# Altium integrated library Stabilizators.IntLib: 148 symbols
Pins are listed as number, name and electrical type; pins without a type are passive.

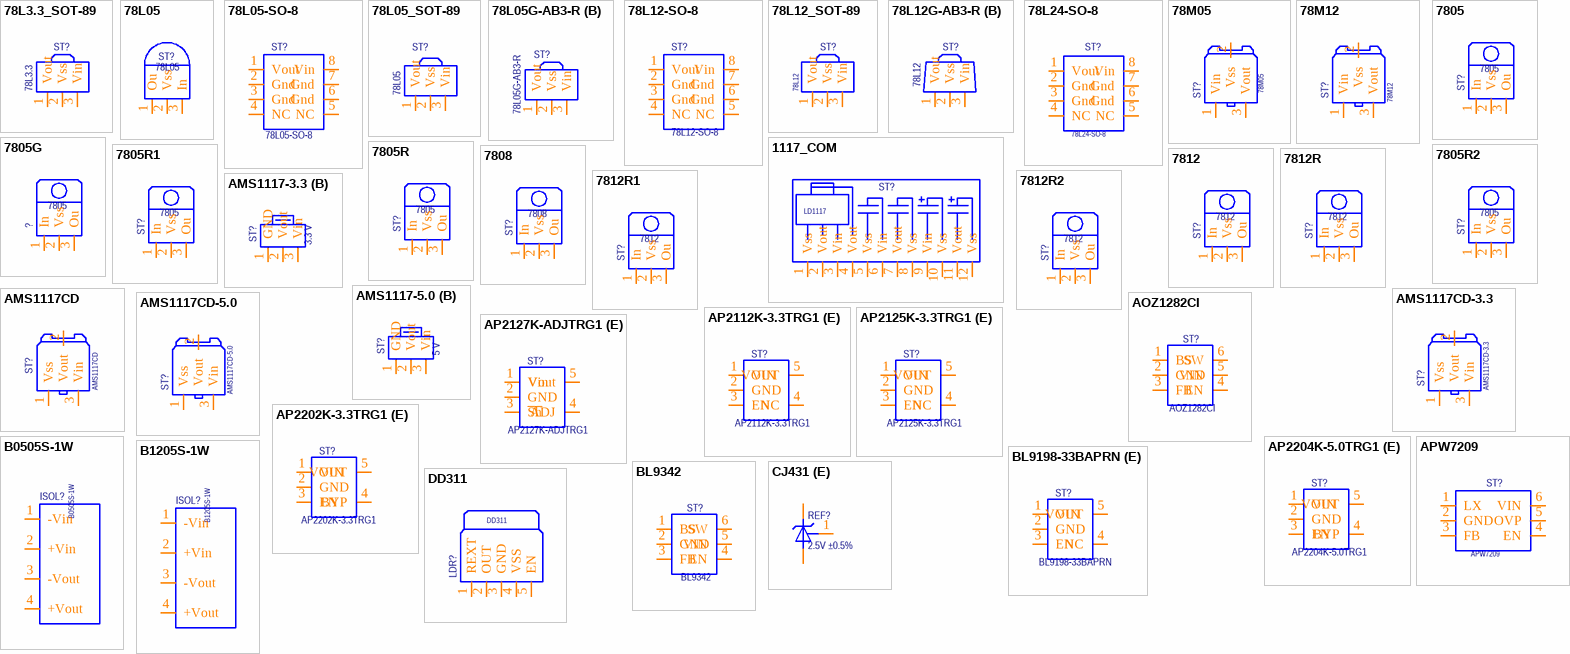
[diagram p0: symbols 78L3.3_SOT-89 to DD311]

## 78L3.3_SOT-89
designator ST?  (value not drawn)
Value: *; Publisher: Catcatcat Electronics; Operating Temperature: -40C to +85C; Website developer: http://catcatcat.d-lan.dp.ua/; Assembly type: Basic Extended Part
footprint SOT-89
footprint SOT-89 ST
pins: 1 Vout, 2 Vss, 3 Vin
text: 78L3.3

## 78L05
designator ST?  value 78L05  (hidden comment: *)
Publisher: Catcatcat Electronics; Operating Temperature: -40C to +85C; Website developer: http://catcatcat.d-lan.dp.ua/; Assembly type: Basic Extended Part
footprint TO-92
footprint SO8
footprint SOT-89
pins: 1 Ou, 2 Vss, 3 In

## 78L05-SO-8
designator ST?  (value not drawn)
Value: {Value}; Publisher: Catcatcat Electronics; Operating Temperature: -40C to +85C; Website developer: http://catcatcat.d-lan.dp.ua/; Assembly type: Basic Extended Part
footprint SO8
pins: 1 Vout, 2 Gnd, 3 Gnd, 4 NC, 5 NC, 6 Gnd, 7 Gnd, 8 Vin

## 78L05_SOT-89
designator ST?  (value not drawn)
Value: {Value}; Publisher: Catcatcat Electronics; Operating Temperature: -40C to +85C; Website developer: http://catcatcat.d-lan.dp.ua/; Assembly type: Basic Extended Part
footprint SOT-89
pins: 1 Vout, 2 Vss (power), 3 Vin
text: 78L05

## 78L05G-AB3-R (B)
designator ST?, comment 78L05G-AB3-R
LINEAR VOLTAGE REGULATORS SOT-89(SOT-89-3) ROHS; Manufacturer: Unisonic Tech; Package / Case: SOT-89-3; PartNumber LCSC: C71136; Publisher: Catcatcat Electronics; Operating Temperature: -40C to +85C; HelpURL: https://datasheet.lcsc.com/szlcsc/Advanced-Monolithic-Systems-AMS-AMS1117-5-0_C6187.pdf; Manufacturer PartNumber: 78L05G-AB3-R; Website developer: http://catcatcat.d-lan.dp.ua/; Detailed Description: LINEAR VOLTAGE REGULATORS SOT-89(SOT-89-3) ROHS; Pricing LCSC: 0.0557; Assembly type: Basic Part; Value: 78L05G-AB3-R
footprint SOT-89-3
pins: 1 Vout, 2 Vss (power), 3 Vin

## 78L12-SO-8
designator ST?  (value not drawn)
Value: {Value}; Publisher: Catcatcat Electronics; Operating Temperature: -40C to +85C; Website developer: http://catcatcat.d-lan.dp.ua/; Assembly type: Basic Extended Part
footprint SO8
pins: 1 Vout, 2 Gnd, 3 Gnd, 4 NC, 5 NC, 6 Gnd, 7 Gnd, 8 Vin

## 78L12_SOT-89
designator ST?  (value not drawn)
Value: {Value}; Publisher: Catcatcat Electronics; Operating Temperature: -40C to +85C; Website developer: http://catcatcat.d-lan.dp.ua/; Assembly type: Basic Extended Part
footprint SOT-89
pins: 1 Vout, 2 Vss, 3 Vin
text: 78L12

## 78L12G-AB3-R (B)
designator ST?, comment value 78L12  (hidden comment: 78L12G-AB3-R)
12 V out LINEAR VOLTAGE REGULATORS SOT-89(SOT-89-3) ROHS; Manufacturer: Unisonic Tech; Package / Case: SOT-89-3; PartNumber LCSC: C75501; Publisher: Catcatcat Electronics; Note: LINEAR VOLTAGE REGULATORS; Operating Temperature: -40C to +85C; HelpURL: https://datasheet.lcsc.com/szlcsc/Unisonic-Tech-78L12G-AB3-R_C75501.pdf; Manufacturer PartNumber: 78L12G-AB3-R; Website developer: http://catcatcat.d-lan.dp.ua/; Detailed Description: LINEAR VOLTAGE REGULATORS SOT-89(SOT-89-3) ROHS; Pricing LCSC: 0.0826; Assembly type: Basic Part
footprint SOT-89
footprint SOT-89 ST
pins: 1 Vout, 2 Vss, 3 Vin

## 78L24-SO-8
designator ST?  (value not drawn)
Value: {Value}; Publisher: Catcatcat Electronics; Operating Temperature: -40C to +85C; Website developer: http://catcatcat.d-lan.dp.ua/; Assembly type: Basic Extended Part
footprint SO8
pins: 1 Vout, 2 Gnd, 3 Gnd, 4 NC, 5 NC, 6 Gnd, 7 Gnd, 8 Vin

## 78M05
designator ST?  (value not drawn)
Value: {Value}; Publisher: Catcatcat Electronics; Operating Temperature: -40C to +85C; Website developer: http://catcatcat.d-lan.dp.ua/; Assembly type: Basic Extended Part
footprint DPAK
footprint 223-DPAC
pins: 1 Vin, 2 Vss, 3 Vout

## 78M12
designator ST?  (value not drawn)
Value: {Value}; Publisher: Catcatcat Electronics; Operating Temperature: -40C to +85C; Website developer: http://catcatcat.d-lan.dp.ua/; Assembly type: Basic Extended Part
footprint DPAK
footprint 223-DPAC
pins: 1 Vin, 2 Vss, 3 Vout

## 1117_COM
designator ST?  (value not drawn)
Value: {Value}; Publisher: Catcatcat Electronics; Operating Temperature: -40C to +85C; Website developer: http://catcatcat.d-lan.dp.ua/; Assembly type: Basic Extended Part
footprint 1117_COM
pins: 1 Vss, 2 Vout, 3 Vin, 4 Vout, 5 Vss, 6 Vin, 7 Vout, 8 Vss, 9 Vin, 10 Vss, 11 Vout, 12 Vss
text: LD1117

## 7805
designator ST?  value 7805  (hidden comment: *)
Publisher: Catcatcat Electronics; Operating Temperature: -40C to +85C; Website developer: http://catcatcat.d-lan.dp.ua/; Assembly type: Basic Extended Part
footprint TO-220A
pins: 1 In, 2 Vss, 3 Ou

## 7805G
designator ?  value 7805  (hidden comment: *)
Publisher: Catcatcat Electronics; Operating Temperature: -40C to +85C; Website developer: http://catcatcat.d-lan.dp.ua/; Assembly type: Basic Extended Part
footprint TO-220G
pins: 1 In, 2 Vss, 3 Ou

## 7805R
designator ST?  value 7805  (hidden comment: *)
Publisher: Catcatcat Electronics; Operating Temperature: -40C to +85C; Website developer: http://catcatcat.d-lan.dp.ua/; Assembly type: Basic Extended Part
footprint TO-220R
pins: 1 In, 2 Vss, 3 Ou

## 7805R1
designator ST?  value 7805  (hidden comment: *)
Publisher: Catcatcat Electronics; Operating Temperature: -40C to +85C; Website developer: http://catcatcat.d-lan.dp.ua/; Assembly type: Basic Extended Part
footprint TO-220-R1
pins: 1 In, 2 Vss, 3 Ou

## 7805R2
designator ST?  value 7805  (hidden comment: *)
Publisher: Catcatcat Electronics; Operating Temperature: -40C to +85C; Website developer: http://catcatcat.d-lan.dp.ua/; Assembly type: Basic Extended Part
footprint TO-220-R2
pins: 1 In, 2 Vss, 3 Ou

## 7808
designator ST?  value 7808  (hidden comment: *)
Publisher: Catcatcat Electronics; Operating Temperature: -40C to +85C; Website developer: http://catcatcat.d-lan.dp.ua/; Assembly type: Basic Extended Part
footprint TO220
pins: 1 In, 2 Vss, 3 Ou

## 7812
designator ST?  value 7812  (hidden comment: *)
Publisher: Catcatcat Electronics; Operating Temperature: -40C to +85C; Website developer: http://catcatcat.d-lan.dp.ua/; Assembly type: Basic Extended Part
footprint TO-220A
pins: 1 In, 2 Vss, 3 Ou

## 7812R
designator ST?  value 7812  (hidden comment: *)
Publisher: Catcatcat Electronics; Operating Temperature: -40C to +85C; Website developer: http://catcatcat.d-lan.dp.ua/; Assembly type: Basic Extended Part
footprint TO-220R
pins: 1 In, 2 Vss, 3 Ou

## 7812R1
designator ST?  value 7812  (hidden comment: *)
Publisher: Catcatcat Electronics; Operating Temperature: -40C to +85C; Website developer: http://catcatcat.d-lan.dp.ua/; Assembly type: Basic Extended Part
footprint TO-220-R1
pins: 1 In, 2 Vss, 3 Ou

## 7812R2
designator ST?  value 7812  (hidden comment: *)
Publisher: Catcatcat Electronics; Operating Temperature: -40C to +85C; Website developer: http://catcatcat.d-lan.dp.ua/; Assembly type: Basic Extended Part
footprint TO-220-R2
pins: 1 In, 2 Vss, 3 Ou

## AMS1117-3.3 (B)
designator ST?, comment value 3.3 V  (hidden comment: AMS1117-3.3)
LOW DROPOUT REGULATORS(LDO) POSITIVE FIXED 1.3V @ 800MA 15V 3.3V 1A SOT-223 ROHS; Manufacturer: Advanced Monolithic Systems; Dealer Аlternative: https://detail.1688.com/offer/520494292842.html; Package / Case: SOT-223; PartNumber LCSC: C6186; Publisher: Catcatcat Electronics; Note: LDO; Operating Temperature: -40 to 125° C; HelpURL: https://datasheet.lcsc.com/szlcsc/1811201117_Advanced-Monolithic-Systems-AMS-AMS1117-3-3_C6186.pdf; Website developer: http://catcatcat.d-lan.dp.ua/; Detailed Description: LOW DROPOUT REGULATORS(LDO) POSITIVE FIXED 1.3V @ 800MA 15V 3.3V 1A SOT-223 ROHS; Pricing LCSC: 0.1193; Assembly type: Basic Part; Supply Input Voltage: 15 V; Voltage: 3.3 V
footprint SOT-223
pins: 1 GND, 2 Vout, 3 Vin

## AMS1117-5.0 (B)
designator ST?, comment value 5 V  (hidden comment: AMS1117-5.0)
LOW DROPOUT REGULATORS(LDO) POSITIVE FIXED 1.3V @ 1A 15V 5V 1A SOT-223 ROHS; Manufacturer: Advanced Monolithic Systems; Dealer Аlternative: https://detail.1688.com/offer/538628349035.html; Package / Case: SOT-223; PartNumber LCSC: C6187; Publisher: Catcatcat Electronics; Note: LDO; Operating Temperature: -40 to 125° C; HelpURL: https://datasheet.lcsc.com/szlcsc/Advanced-Monolithic-Systems-AMS-AMS1117-5-0_C6187.pdf; Manufacturer PartNumber: AMS1117-5.0; Website developer: http://catcatcat.d-lan.dp.ua/; Detailed Description: LOW DROPOUT REGULATORS(LDO) POSITIVE FIXED 1.3V @ 1A 15V 5V 1A SOT-223 ROHS; Pricing LCSC: 0.1283; Assembly type: Basic Extended Part
footprint SOT-223
pins: 1 GND, 2 Vout, 3 Vin

## AMS1117CD
designator ST?  (value not drawn)
Value: 3.3 V; Note: AMS1117; Dealer Аlternative: https://detail.1688.com/offer/534895728311.html; Package / Case: DPAK; PartNumber Digi-Key: 0.2; PartNumber LCSC: 0.032; Publisher: Catcatcat Electronics; Operating Temperature: -40 to 125° C; Website developer: http://catcatcat.d-lan.dp.ua/; Assembly type: Basic Extended Part
footprint DPAK_SOT223
pins: 1 Vss, 2 Vout, 3 Vin

## AMS1117CD-3.3
designator ST?  (value not drawn)
DPAK 3.3V; Note: AMS1117; Value: 3.3 V; Dealer Аlternative: https://detail.1688.com/offer/534895728311.html; Package / Case: DPAK (TO-252); PartNumber Digi-Key: 0.2; PartNumber LCSC: 0.032; Publisher: Catcatcat Electronics; Operating Temperature: -40 to 125° C; Website developer: http://catcatcat.d-lan.dp.ua/; Assembly type: Basic Extended Part
footprint DPAK_SOT223
pins: 1 Vss, 2 Vout, 3 Vin

## AMS1117CD-5.0
designator ST?  (value not drawn)
DPAK 5.0V; Note: AMS1117; Value: 5.0 V; Dealer Аlternative: https://detail.1688.com/offer/534895728311.html; Package / Case: DPAK (TO-252); PartNumber Digi-Key: 0.2; PartNumber LCSC: 0.032; Publisher: Catcatcat Electronics; Operating Temperature: -40 to 125° C; Website developer: http://catcatcat.d-lan.dp.ua/; Assembly type: Basic Extended Part
footprint DPAK_SOT223
pins: 1 Vss, 2 Vout, 3 Vin

## AOZ1282CI
designator ST?  value AOZ1282CI  (hidden comment: *)
SOT-23-6, IN 4.5V 36V, OU 0.8V 36V 1.2A DC-DC Converters Step-Down Adjustable 1; Manufacturer: Alpha & Omega Semicon/AOS; Voltage: 4.5V 30V 0.8V 15V 1.2A; Marking: 702K3 AZ00; Detailed Description: DC-DC Converters Step-Down Adjustable 1 4.5V 36V 0.8V 36V 1.2A SOT-23-6 RoHS; Pricing Аlternative: 0.2591; ComponentLink1URL: http://www.microchip.com/wwwproducts/en/en554058; ComponentLink2URL: http://ww1.microchip.com/downloads/en/DeviceDoc/20005004D.pdf; Dealer LCSC: https://lcsc.com/product-detail/DC-DC-Converters_Alpha-Omega-Semicon_AOZ1282CI_Alpha-Omega-Semicon-AOS-AOZ1282CI_C111916.html; Package / Case: SOT-23-6; PartNumber LCSC: C111916; Operating Temperature: -40C to +85C; HelpURL: https://datasheet.lcsc.com/szlcsc/Alpha-Omega-Semicon-AOS-AOZ1282CI_C111916.pdf; Manufacturer PartNumber: AOZ1282CI; Publisher: Catcatcat Electronics; Website developer: http://catcatcat.d-lan.dp.ua/; Assembly type: Basic Extended Part
footprint SOT457 (SC-74; TSOP6)
pins: 1 BS, 2 GND, 3 FB, 4 EN, 5 VIN, 6 SW

## AP2112K-3.3TRG1 (E)
designator ST?, comment AP2112K-3.3TRG1
SOT-25 Vin 6.5V  Vout 3.3V 600mA; Manufacturer: Diodes Incorporated; Marking: G3P; Detailed Description: LOW DROPOUT REGULATORS(LDO) SOT-25 ROHS; ComponentLink1URL: http://www.microchip.com/wwwproducts/en/en554058; ComponentLink2URL: http://ww1.microchip.com/downloads/en/DeviceDoc/20005004D.pdf; Package / Case: SOT-25; PartNumber LCSC: C51118; Operating Temperature: -40C to +85C; Voltage: Vin 6.5V  Vout 3.3V 600mA; HelpURL: https://datasheet.lcsc.com/szlcsc/Diodes-Incorporated-AP2112K-3-3TRG1_C51118.pdf; Manufacturer PartNumber: AP2112K-3.3TRG1; Pricing LCSC: 0.1350; Publisher: Catcatcat Electronics; Website developer: http://catcatcat.d-lan.dp.ua/; Assembly type: Extended Part; Value: AP2112K-3.3TRG1
footprint SOT753 (SOT25, TSOP5)
pins: 1 VIN, 2 GND, 3 EN, 4 NC, 5 VOUT

## AP2125K-3.3TRG1 (E)
designator ST?, comment AP2125K-3.3TRG1
SOT-25 Vin 6.5V  Vout 3.3V 300mA; Manufacturer: Diodes Incorporated; Voltage: Vin 6.5V  Vout 3.3V 600mA; Marking: GCG; Detailed Description: LOW DROPOUT REGULATORS(LDO) POSITIVE FIXED 300MV @ 300MA 6V 3.3V 360MA SOT-23-5 ROHS; ComponentLink1URL: http://www.microchip.com/wwwproducts/en/en554058; ComponentLink2URL: http://ww1.microchip.com/downloads/en/DeviceDoc/20005004D.pdf; Package / Case: SOT-23-5; PartNumber LCSC: C110463; Operating Temperature: -40C to +85C; HelpURL: https://datasheet.lcsc.com/szlcsc/Diodes-Incorporated-AP2125K-3-3TRG1_C110463.pdf; Manufacturer PartNumber: AP2125K-3.3TRG1; Pricing LCSC: 0.1040; Publisher: Catcatcat Electronics; Website developer: http://catcatcat.d-lan.dp.ua/; Assembly type: Extended Part; Value: AP2125K-3.3TRG1
footprint SOT753 (SOT25, TSOP5)
pins: 1 VIN, 2 GND, 3 EN, 4 NC, 5 VOUT

## AP2127K-ADJTRG1 (E)
designator ST?, comment AP2127K-ADJTRG1
SOT-25 Vin 6V  ADJ 300mA; Manufacturer: Diodes Incorporated; Marking: S2RC; Detailed Description: LOW DROPOUT REGULATORS(LDO) POSITIVE ADJUSTABLE 300MV @ 300MA 6V 0.8V 5.5V 400MA SOT-23-5 ROHS; ComponentLink1URL: http://www.microchip.com/wwwproducts/en/en554058; ComponentLink2URL: http://ww1.microchip.com/downloads/en/DeviceDoc/20005004D.pdf; Package / Case: SOT-23-5; PartNumber LCSC: C96343; Operating Temperature: -40C to +85C; Voltage: Vin 6V  ADJ 300mA; HelpURL: https://datasheet.lcsc.com/szlcsc/Diodes-Incorporated-AP2127K-ADJTRG1_C96343.pdf; Manufacturer PartNumber: AP2127K-ADJTRG1; Pricing LCSC: 0.0606; Publisher: Catcatcat Electronics; Website developer: http://catcatcat.d-lan.dp.ua/; Assembly type: Extended Part; Value: AP2127K-ADJTRG1
footprint SOT753 (SOT25, TSOP5)
pins: 1 Vin, 2 GND, 3 ~{Sh}, 4 ADJ, 5 Vout

## AP2202K-3.3TRG1 (E)
designator ST?, comment AP2202K-3.3TRG1
SOT-25 Vin 6.5V  Vout 3.3V 150mA; Manufacturer: Diodes Incorporated; Marking: G2L; Detailed Description: LOW DROPOUT REGULATORS(LDO) SOT-23-5 ROHS; ComponentLink1URL: http://www.microchip.com/wwwproducts/en/en554058; ComponentLink2URL: http://ww1.microchip.com/downloads/en/DeviceDoc/20005004D.pdf; Package / Case: SOT-23-5; PartNumber LCSC: C150442; Operating Temperature: -40C to +85C; Voltage: Vin 6.5V  Vout 3.3V 150mA; HelpURL: https://datasheet.lcsc.com/szlcsc/Diodes-Incorporated-AP2202K-3-3TRG1_C150442.pdf; Manufacturer PartNumber: AP2202K-3.3TRG1; Pricing LCSC: 0.0959; Publisher: Catcatcat Electronics; Website developer: http://catcatcat.d-lan.dp.ua/; Assembly type: Extended Part; Value: AP2202K-3.3TRG1
footprint SOT753 (SOT25, TSOP5)
pins: 1 VIN, 2 GND, 3 EN, 4 BYP, 5 VOUT

## AP2204K-5.0TRG1 (E)
designator ST?, comment AP2204K-5.0TRG1
SOT-25 Vin 6.5V  Vout 5V 150mA; Manufacturer: Diodes Incorporated; Marking: GAI; Detailed Description: LOW DROPOUT REGULATORS(LDO) POSITIVE FIXED 500MV @ 150MA 24V 5V 200MA SOT-23-5 ROHS; ComponentLink1URL: http://www.microchip.com/wwwproducts/en/en554058; ComponentLink2URL: http://ww1.microchip.com/downloads/en/DeviceDoc/20005004D.pdf; Package / Case: SOT-23-5; PartNumber LCSC: C112031; Operating Temperature: -40C to +85C; Voltage: Vin 6.5V  Vout 5V 150mA; HelpURL: https://datasheet.lcsc.com/szlcsc/Diodes-Incorporated-AP2204K-5-0TRG1_C112031.pdf; Manufacturer PartNumber: AP2204K-5.0TRG1; Pricing LCSC: 0.1558; Publisher: Catcatcat Electronics; Website developer: http://catcatcat.d-lan.dp.ua/; Assembly type: Extended Part; Value: AP2204K-5.0TRG1
footprint SOT753 (SOT25, TSOP5)
pins: 1 VIN, 2 GND, 3 EN, 4 BYP, 5 VOUT

## APW7209
designator ST?  (value not drawn)
Value: {Value}; Publisher: Catcatcat Electronics; Operating Temperature: -40C to +85C; Website developer: http://catcatcat.d-lan.dp.ua/; Assembly type: Basic Extended Part
footprint SOT-23-6N
pins: 1 LX, 2 GND, 3 FB, 4 EN, 5 OVP, 6 VIN

## B0505S-1W
designator ISOL?  (value not drawn)
Value: {Value}; Publisher: Catcatcat Electronics; Operating Temperature: -40C to +85C; Website developer: http://catcatcat.d-lan.dp.ua/; Assembly type: Basic Extended Part
footprint 4PINSIP
pins: 1 -Vin, 2 +Vin, 3 -Vout, 4 +Vout

## B1205S-1W
designator ISOL?  (value not drawn)
Value: {Value}; Publisher: Catcatcat Electronics; Operating Temperature: -40C to +85C; Website developer: http://catcatcat.d-lan.dp.ua/; Assembly type: Basic Extended Part
footprint 4PINSIP
pins: 1 -Vin, 2 +Vin, 3 -Vout, 4 +Vout

## BL9198-33BAPRN (E)
designator ST?, comment BL9198-33BAPRN
SOT-25 Vin 6.5V  Vout 3.3V 300mA; Manufacturer: Diodes Incorporated; Note: LOW DROPOUT REGULATORS(LDO); Marking: DK__; Detailed Description: LOW DROPOUT REGULATORS(LDO) POSITIVE FIXED 300MV @ 300MA 6V 3.3V 300MA SOT-23-5 ROHS; ComponentLink1URL: http://www.microchip.com/wwwproducts/en/en554058; ComponentLink2URL: http://ww1.microchip.com/downloads/en/DeviceDoc/20005004D.pdf; Package / Case: SOT-23-5; PartNumber LCSC: C51282; Operating Temperature: -40C to +85C; Voltage: Vin 6.5V  Vout 3.3V 300mA; HelpURL: https://datasheet.lcsc.com/szlcsc/Shanghai-Belling-BL9198-33BAPRN_C51282.pdf; Manufacturer PartNumber: BL9198-33BAPRN; Pricing LCSC: 0.0590; Publisher: Catcatcat Electronics; Website developer: http://catcatcat.d-lan.dp.ua/; Assembly type: Extended Part; Value: BL9198-33BAPRN
footprint SOT753 (SOT25, TSOP5)
pins: 1 VIN, 2 GND, 3 EN, 4 NC, 5 VOUT

## BL9342
designator ST?  value BL9342  (hidden comment: *)
SOT-23-6, IN 4.2V 40V, OU 0.8V 40V 1.2A DC-DC Converters Step-Down Adjustable 1; Manufacturer: Shanghai Belling; Voltage: 1 4.2V 40V 40V 600mA; Marking: 8NJN; Detailed Description: DC-DC Converters Step-Down Adjustable 1 4.2V 40V 40V 600mA SOT-23-6 RoHS; ComponentLink1URL: http://www.microchip.com/wwwproducts/en/en554058; ComponentLink2URL: http://ww1.microchip.com/downloads/en/DeviceDoc/20005004D.pdf; Dealer LCSC: https://lcsc.com/product-detail/DC-DC-Converters_BL9342_C93176.html; Package / Case: SOT-23-6; PartNumber LCSC: C93176; Operating Temperature: -40C to +85C; HelpURL: https://datasheet.lcsc.com/szlcsc/Shanghai-Belling-BL9342_C93176.pdf; Manufacturer PartNumber: BL9342; Pricing LCSC: 0.1818; Publisher: Catcatcat Electronics; Website developer: http://catcatcat.d-lan.dp.ua/; Assembly type: Basic Extended Part
footprint SOT457 (SC-74; TSOP6)
pins: 1 BS, 2 GND, 3 FB, 4 EN, 5 VIN, 6 SW

## CJ431 (E)
designator REF?, comment value 2.5V ±0.5%  (hidden comment: CJ431)
VOLTAGE REFERENCES 2.5V 36V ±0.5% 50PPM/°C SOT-23(SOT-23-3) ROHS; Manufacturer: Changjiang Electronics Tech (CJ); Marking: 431; Package / Case: SOT-23; PartNumber LCSC: C3113; Publisher: Catcatcat Electronics; Note: VOLTAGE REFERENCES 2.5V; Operating Temperature: -40C to +85C; Tolerance: ±0.5%; Voltage: 2.5V ±0.5%; HelpURL: https://datasheet.lcsc.com/szlcsc/Changjiang-Electronics-Tech-CJ-CJ431_C3113.pdf; Manufacturer PartNumber: CJ431; Website developer: http://catcatcat.d-lan.dp.ua/; Detailed Description: VOLTAGE REFERENCES 2.5V 36V ±0.5% 50PPM/°C SOT-23(SOT-23-3) ROHS; Pricing LCSC: 0.0441; Assembly type: Extended Part
footprint SOT-23-3M
pins: 1 REF, 2 CATHODE, 3 ANODE

## DD311
designator LDR?  (value not drawn)
Value: {Value}; Publisher: Catcatcat Electronics; Operating Temperature: -40C to +85C; Website developer: http://catcatcat.d-lan.dp.ua/; Assembly type: Basic Extended Part
footprint DD311
pins: 1 REXT, 2 OUT, 3 GND, 4 VSS, 5 EN

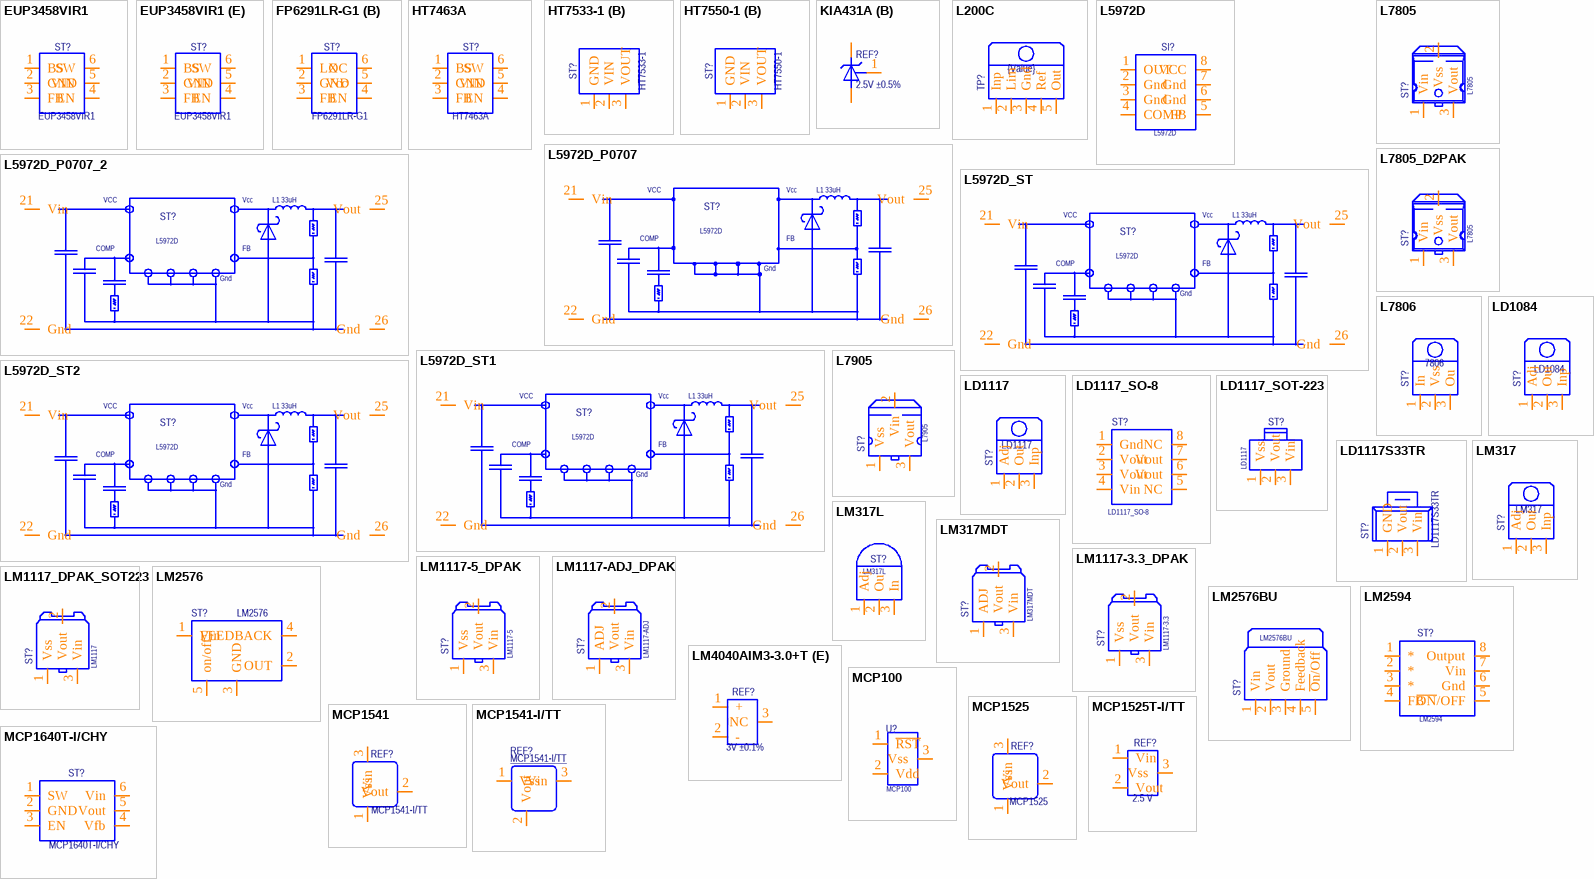
[diagram p1: symbols EUP3458VIR1 to MCP1640T-I/CHY]

## EUP3458VIR1
designator ST?  value EUP3458VIR1  (hidden comment: *)
SOT-23-6, IN 4.5V-30V, OU 0.8V-15V 1.2A DC-DC Converters Step-Down Adjustable 1; Manufacturer: Eutech Microelectronics; Voltage: 4.5V 30V 0.8V 15V 1.2A; Marking: 702K3 AZ00; Detailed Description: DC-DC Converters Step-Down Adjustable 1 4.5V 30V 0.8V 15V 1.2A SOT-23-6 RoHS; ComponentLink1URL: http://www.microchip.com/wwwproducts/en/en554058; ComponentLink2URL: http://ww1.microchip.com/downloads/en/DeviceDoc/20005004D.pdf; Dealer LCSC: https://lcsc.com/product-detail/DC-DC-Converters_EUP3458VIR1_C89300.html; Package / Case: SOT-23-6; PartNumber LCSC: C89300; Operating Temperature: -40C to +85C; HelpURL: https://datasheet.lcsc.com/szlcsc/Eutech-Microelectronics-EUP3458VIR1_C89300.pdf; Manufacturer PartNumber: EUP3458VIR1; Pricing LCSC: 0.1606; Publisher: Catcatcat Electronics; Website developer: http://catcatcat.d-lan.dp.ua/; Assembly type: Basic Extended Part
footprint SOT457 (SC-74; TSOP6)
pins: 1 BS, 2 GND, 3 FB, 4 EN, 5 VIN, 6 SW

## EUP3458VIR1 (E)
designator ST?, comment EUP3458VIR1
SOT-23-6, IN 4.5V-30V, OU 0.8V-15V 1.2A DC-DC Converters Step-Down Adjustable 1; Manufacturer: Eutech Microelectronics; Voltage: 4.5V 30V 0.8V 15V 1.2A; Marking: 702K3 AZ00; Detailed Description: DC-DC Converters Step-Down Adjustable 1 4.5V 30V 0.8V 15V 1.2A SOT-23-6 RoHS; ComponentLink1URL: http://www.microchip.com/wwwproducts/en/en554058; ComponentLink2URL: http://ww1.microchip.com/downloads/en/DeviceDoc/20005004D.pdf; Package / Case: SOT-23-6; PartNumber LCSC: C89300; Note: DC-DC CONVERTERS STEP-DOWN ADJ; Operating Temperature: -40C to +85C; HelpURL: https://datasheet.lcsc.com/szlcsc/Eutech-Microelectronics-EUP3458VIR1_C89300.pdf; Manufacturer PartNumber: EUP3458VIR1; Pricing LCSC: 0.1292; Publisher: Catcatcat Electronics; Website developer: http://catcatcat.d-lan.dp.ua/; Assembly type: Extended Part; Value: EUP3458VIR1
footprint SOT457 (SC-74; TSOP6)
pins: 1 BS, 2 GND, 3 FB, 4 EN, 5 VIN, 6 SW

## FP6291LR-G1 (B)
designator ST?, comment FP6291LR-G1
DC-DC CONVERTERS STEP-UP ADJUSTABLE 1 2.6V 5.5V 12V 2A SOT-23-6 ROHS; Manufacturer: Feeling Tech; Marking: AL968; ComponentLink1URL: http://www.microchip.com/wwwproducts/en/en554058; ComponentLink2URL: http://ww1.microchip.com/downloads/en/DeviceDoc/20005004D.pdf; Package / Case: SOT-23-6; PartNumber LCSC: C18701; Publisher: Catcatcat Electronics; Note: DC-DC CONVERTERS STEP-UP; Operating Temperature: -40°C ~ 125°C (TJ); Voltage: 1 2.6V 5.5V 12V 2A; HelpURL: https://datasheet.lcsc.com/szlcsc/1812101116_Feeling-Tech-FP6291LR-G1_C18701.pdf; Manufacturer PartNumber: FP6291LR-G1; Website developer: http://catcatcat.d-lan.dp.ua/; Detailed Description: DC-DC CONVERTERS STEP-UP ADJUSTABLE 1 2.6V 5.5V 12V 2A SOT-23-6 ROHS; Pricing LCSC: 0.1278; Assembly type: Basic Part; Supply Input Voltage: 2.6V 5.5V; Value: FP6291LR-G1
footprint SOT-23-6L
pins: 1 LX, 2 GND, 3 FB, 4 EN, 5 Vcc, 6 OC

## HT7463A
designator ST?  value HT7463A  (hidden comment: *)
SOT-23-6, IN 5V 50V, OU 0.6V 50V 0.8A DC-DC Converters Step-Down Adjustable 1; Manufacturer: Holtek Semicon; Voltage: 4.5V 52V 1V 600mA; Marking: 463A; Detailed Description: DC-DC Converters Step-Down Adjustable 1 4.5V 52V 1V 600mA SOT-23-6 RoHS; ComponentLink1URL: http://www.microchip.com/wwwproducts/en/en554058; ComponentLink2URL: http://ww1.microchip.com/downloads/en/DeviceDoc/20005004D.pdf; Dealer LCSC: https://lcsc.com/product-detail/DC-DC-Converters_HT7463A_C111872.html; Package / Case: SOT-23-6; PartNumber LCSC: C111872; Operating Temperature: -40C to +85C; HelpURL: https://datasheet.lcsc.com/szlcsc/Holtek-Semicon-HT7463A_C111872.pdf; Manufacturer PartNumber: HT7463A; Pricing LCSC: 0.1379; Publisher: Catcatcat Electronics; Website developer: http://catcatcat.d-lan.dp.ua/; Assembly type: Basic Extended Part
footprint SOT457 (SC-74; TSOP6)
pins: 1 BS, 2 GND, 3 FB, 4 EN, 5 VIN, 6 SW

## HT7533-1 (B)
designator ST?, comment HT7533-1
LOW DROPOUT REGULATORS(LDO) POSITIVE FIXED 55MV @ 1MA 30V 3.3V 100MA SOT-89(SOT-89-3) ROHS; Manufacturer: Holtek Semicon; Voltage: Vin 30.0 Vout 3.3V; Marking: 7533-1; ComponentLink1URL: http://www.microchip.com/wwwproducts/en/en554058; ComponentLink2URL: http://ww1.microchip.com/downloads/en/DeviceDoc/20005004D.pdf; Package / Case: SOT-89-3; PartNumber LCSC: C14289; Note: LDO; Operating Temperature: -40C to +85C; HelpURL: https://datasheet.lcsc.com/szlcsc/1812071811_Holtek-Semicon-HT7533-1_C14289.pdf; Manufacturer PartNumber: HT7533-1; Detailed Description: LOW DROPOUT REGULATORS(LDO) POSITIVE FIXED 55MV @ 1MA 30V 3.3V 100MA SOT-89(SOT-89-3) ROHS; Pricing LCSC: 0.1189; Publisher: Catcatcat Electronics; Website developer: http://catcatcat.d-lan.dp.ua/; Assembly type: Basic Part; Value: HT7533-1
footprint SOT-89
footprint SOT-89 NPX
pins: 1 GND, 2 VIN, 3 VOUT

## HT7550-1 (B)
designator ST?, comment HT7550-1
LOW DROPOUT REGULATORS(LDO) POSITIVE FIXED 55MV @ 1MA 30V 5V 150MA SOT-89(SOT-89-3) ROHS; Manufacturer: Holtek Semicon; Voltage: Vin 30.0 Vout 3.3V; Marking: 7533-1; ComponentLink1URL: http://www.microchip.com/wwwproducts/en/en554058; ComponentLink2URL: http://ww1.microchip.com/downloads/en/DeviceDoc/20005004D.pdf; Package / Case: SOT-89-3; PartNumber LCSC: C16106; Note: LDO; Operating Temperature: -40C to +85C; HelpURL: https://datasheet.lcsc.com/szlcsc/1812071811_Holtek-Semicon-HT7550-1_C16106.pdf; Manufacturer PartNumber: HT7550-1; Detailed Description: LOW DROPOUT REGULATORS(LDO) POSITIVE FIXED 55MV @ 1MA 30V 5V 150MA SOT-89(SOT-89-3) ROHS; Pricing LCSC: 0.1189; Publisher: Catcatcat Electronics; Website developer: http://catcatcat.d-lan.dp.ua/; Assembly type: Basic Part; Value: HT7550-1
footprint SOT-89
pins: 1 GND, 2 VIN, 3 VOUT

## KIA431A (B)
designator REF?, comment value 2.5V ±0.5%  (hidden comment: KIA431A)
VOLTAGE REFERENCES 2.5V 36V ±0.5% 30PPM/°C SOT-23(SOT-23-3) ROHS; Manufacturer: KIA Semicon Tech; Package / Case: SOT-23; PartNumber LCSC: C116375; Publisher: Catcatcat Electronics; Note: VOLTAGE REFERENCES; Operating Temperature: -40C to +85C; Tolerance: ±0.5%; Voltage: 2.5V ±0.5%; HelpURL: https://datasheet.lcsc.com/szlcsc/KIA-Semicon-Tech-KIA431A_C116375.pdf; Manufacturer PartNumber: KIA431A; Website developer: http://catcatcat.d-lan.dp.ua/; Detailed Description: VOLTAGE REFERENCES 2.5V 36V ±0.5% 30PPM/°C SOT-23(SOT-23-3) ROHS; Pricing LCSC: 0.0232; Assembly type: Extended Part
footprint SOT-23-3M
pins: 1 REF, 2 CATHODE, 3 ANODE

## L200C
designator TP?  value {Value}  (hidden comment: *)
Publisher: Catcatcat Electronics; Operating Temperature: -40C to +85C; Website developer: http://catcatcat.d-lan.dp.ua/; Assembly type: Basic Extended Part
footprint L200C
pins: 1 Inp, 2 Lim, 3 Gnd, 4 Ref, 5 Out

## L5972D
designator SI?  (value not drawn)
Value: {Value}; Publisher: Catcatcat Electronics; Operating Temperature: -40C to +85C; Website developer: http://catcatcat.d-lan.dp.ua/; Assembly type: Basic Extended Part
footprint SO8
pins: 1 OUT, 2 Gnd, 3 Gnd, 4 COMP, 5 FB, 6 Gnd, 7 Gnd, 8 VCC

## L5972D_P0707
designator ST?  (value not drawn)
Value: {Value}; Publisher: Catcatcat Electronics; Operating Temperature: -40C to +85C; Website developer: http://catcatcat.d-lan.dp.ua/; Assembly type: Basic Extended Part
footprint L5972D_P0707
pins: 21 Vin, 22 Gnd, 25 Vout, 26 Gnd
text: VCC; Vcc; L1 33uH; L5972D; COMP; FB

## L5972D_P0707_2
designator ST?  (value not drawn)
Value: {Value}; Publisher: Catcatcat Electronics; Operating Temperature: -40C to +85C; Website developer: http://catcatcat.d-lan.dp.ua/; Assembly type: Basic Extended Part
footprint L5972D_P0707_2
pins: 1 hidden, 2 hidden, 3 hidden, 4 hidden, 5 hidden, 6 hidden, 7 hidden, 8 hidden, 9 hidden, 10 hidden, 11 hidden, 12 hidden, 13 hidden, 14 hidden, 15 hidden, 16 hidden, 17 hidden, 18 hidden, 19 hidden, 20 hidden, 21 Vin, 22 Gnd, 23 hidden, 24 hidden, 25 Vout, 26 Gnd, 27 hidden, 28 hidden
text: VCC; Vcc; L1 33uH; L5972D; COMP; FB

## L5972D_ST
designator ST?  (value not drawn)
Value: {Value}; Publisher: Catcatcat Electronics; Operating Temperature: -40C to +85C; Website developer: http://catcatcat.d-lan.dp.ua/; Assembly type: Basic Extended Part
footprint L5972D_ST
pins: 1 hidden, 2 hidden, 3 hidden, 4 hidden, 5 hidden, 6 hidden, 7 hidden, 8 hidden, 9 hidden, 10 hidden, 11 hidden, 12 hidden, 13 hidden, 14 hidden, 15 hidden, 16 hidden, 17 hidden, 18 hidden, 19 hidden, 20 hidden, 21 Vin, 22 Gnd, 23 hidden, 24 hidden, 25 Vout, 26 Gnd
text: VCC; Vcc; L1 33uH; L5972D; COMP; FB

## L5972D_ST1
designator ST?  (value not drawn)
Value: {Value}; Publisher: Catcatcat Electronics; Operating Temperature: -40C to +85C; Website developer: http://catcatcat.d-lan.dp.ua/; Assembly type: Basic Extended Part
footprint L5972D_ST1
pins: 1 hidden, 2 hidden, 3 hidden, 4 hidden, 5 hidden, 6 hidden, 7 hidden, 8 hidden, 9 hidden, 10 hidden, 11 hidden, 12 hidden, 13 hidden, 14 hidden, 15 hidden, 16 hidden, 17 hidden, 18 hidden, 19 hidden, 20 hidden, 21 Vin, 22 Gnd, 23 hidden, 24 hidden, 25 Vout, 26 Gnd
text: VCC; Vcc; L1 33uH; L5972D; COMP; FB

## L5972D_ST2
designator ST?  (value not drawn)
Value: {Value}; Publisher: Catcatcat Electronics; Operating Temperature: -40C to +85C; Website developer: http://catcatcat.d-lan.dp.ua/; Assembly type: Basic Extended Part
footprint L5972D_ST2
pins: 21 Vin, 22 Gnd, 25 Vout, 26 Gnd
text: VCC; Vcc; L1 33uH; L5972D; COMP; FB

## L7805
designator ST?  (value not drawn)
Value: {Value}; Publisher: Catcatcat Electronics; Operating Temperature: -40C to +85C; Website developer: http://catcatcat.d-lan.dp.ua/; Assembly type: Basic Extended Part
footprint SMP-FD
pins: 1 Vin, 2 Vss, 3 Vout

## L7805_D2PAK
designator ST?  (value not drawn)
Value: {Value}; Publisher: Catcatcat Electronics; Operating Temperature: -40C to +85C; Website developer: http://catcatcat.d-lan.dp.ua/; Assembly type: Basic Extended Part
footprint D2PAK
pins: 1 Vin, 2 Vss, 3 Vout
text: L7805

## L7806
designator ST?  value 7806  (hidden comment: *)
Publisher: Catcatcat Electronics; Operating Temperature: -40C to +85C; Website developer: http://catcatcat.d-lan.dp.ua/; Assembly type: Basic Extended Part
footprint TO-220(3)metal_V
footprint TO-220(3)plastik_V
pins: 1 In, 2 Vss, 3 Ou

## L7905
designator ST?  (value not drawn)
Value: {Value}; Publisher: Catcatcat Electronics; Operating Temperature: -40C to +85C; Website developer: http://catcatcat.d-lan.dp.ua/; Assembly type: Basic Extended Part
footprint SMP-FD
pins: 1 Vss, 2 Vin, 3 Vout

## LD1084
designator ST?  value LD1084  (hidden comment: *)
Publisher: Catcatcat Electronics; Operating Temperature: -40C to +85C; Website developer: http://catcatcat.d-lan.dp.ua/; Assembly type: Basic Extended Part
footprint TO-220G
pins: 1 Adj, 2 Out, 3 Inp

## LD1117
designator ST?  value LD1117  (hidden comment: *)
Publisher: Catcatcat Electronics; Operating Temperature: -40C to +85C; Website developer: http://catcatcat.d-lan.dp.ua/; Assembly type: Basic Extended Part
footprint TO-220G
pins: 1 Adj, 2 Out, 3 Inp

## LD1117_SO-8
designator ST?  (value not drawn)
Value: LD1117; Publisher: Catcatcat Electronics; Operating Temperature: -40C to +85C; Website developer: http://catcatcat.d-lan.dp.ua/; Assembly type: Basic Extended Part
footprint SO8
pins: 1 Gnd, 2 Vout, 3 Vout, 4 Vin, 5 NC, 6 Vout, 7 Vout, 8 NC

## LD1117_SOT-223
designator ST?  (value not drawn)
Value: LD1117; Publisher: Catcatcat Electronics; Operating Temperature: -40C to +85C; Website developer: http://catcatcat.d-lan.dp.ua/; Assembly type: Basic Extended Part
footprint SOT-223
pins: 1 Vss, 2 Vout, 3 Vin

## LD1117S33TR
designator ST?
IC REG LINEAR 3.3V 800MA SOT223; Manufacturer: STMicroelectronics; Note: Regulators - Linear; Voltage: 15V; Detailed Description: Linear Voltage Regulator IC Positive Fixed 1 Output  800mA SOT-223; Dealer Аlternative: https://www.digikey.com/product-detail/en/stmicroelectronics/LD1117S33TR/497-1242-2-ND/585766; Package / Case: SOT-223; PartNumber Digi-Key: 0.14492; Publisher: Catcatcat Electronics; Operating Temperature: -40C to +85C; HelpURL: http://www.st.com/content/ccc/resource/technical/document/datasheet/99/3b/7d/91/91/51/4b/be/CD00000544.pdf/files/CD00000544.pdf/jcr:content/translations/en.CD00000544.pdf; Manufacturer PartNumber: LD1117S33TR; Website developer: http://catcatcat.d-lan.dp.ua/; Value: LD1117S33TR; Assembly type: Basic Extended Part
footprint SOT-223
pins: 1 GND, 2 Vout, 3 Vin

## LM317
designator ST?  value LM317  (hidden comment: *)
Publisher: Catcatcat Electronics; Operating Temperature: -40C to +85C; Website developer: http://catcatcat.d-lan.dp.ua/; Assembly type: Basic Extended Part
footprint TO-220
pins: 1 Adj, 2 Out, 3 Inp

## LM317L
designator ST?  (value not drawn)
Value: *; Publisher: Catcatcat Electronics; Operating Temperature: -40C to +85C; Website developer: http://catcatcat.d-lan.dp.ua/; Assembly type: Basic Extended Part
footprint TO-92
pins: 1 Adj, 2 Ou, 3 In

## LM317MDT
designator ST?  (value not drawn)
Value: *; Publisher: Catcatcat Electronics; Operating Temperature: -40C to +85C; Website developer: http://catcatcat.d-lan.dp.ua/; Assembly type: Basic Extended Part
footprint DPAK
pins: 1 ADJ, 2 Vout, 3 Vin

## LM1117-3.3_DPAK
designator ST?  (value not drawn)
3.3 V; Value: AMS1117CD; Dealer Аlternative: https://detail.1688.com/offer/534895728311.html; Package / Case: DPAK; PartNumber LCSC: 0.044; Publisher: Catcatcat Electronics; Operating Temperature: -40C to +85C; Voltage: 3.3 V; Website developer: http://catcatcat.d-lan.dp.ua/; Assembly type: Basic Extended Part
footprint DPAK
pins: 1 Vss, 2 Vout, 3 Vin
text: LM1117-3.3

## LM1117-5_DPAK
designator ST?  (value not drawn)
Value: *; Publisher: Catcatcat Electronics; Operating Temperature: -40C to +85C; Website developer: http://catcatcat.d-lan.dp.ua/; Assembly type: Basic Extended Part
footprint DPAK
pins: 1 Vss, 2 Vout, 3 Vin
text: LM1117-5

## LM1117-ADJ_DPAK
designator ST?  (value not drawn)
Value: *; Publisher: Catcatcat Electronics; Operating Temperature: -40C to +85C; Website developer: http://catcatcat.d-lan.dp.ua/; Assembly type: Basic Extended Part
footprint DPAK
pins: 1 ADJ, 2 Vout, 3 Vin
text: LM1117-ADJ

## LM1117_DPAK_SOT223
designator ST?  (value not drawn)
Value: 3.3 V; Note: AMS1117; Dealer Аlternative: https://detail.1688.com/offer/534895728311.html; Package / Case: DPAK; PartNumber Digi-Key: 0.2; PartNumber LCSC: 0.032; Publisher: Catcatcat Electronics; Operating Temperature: -40C to +85C; Website developer: http://catcatcat.d-lan.dp.ua/; Assembly type: Basic Extended Part
footprint DPAK_SOT223
pins: 1 Vss, 2 Vout, 3 Vin
text: LM1117

## LM2576
designator ST?  value LM2576  (hidden comment: *)
Publisher: Catcatcat Electronics; Operating Temperature: -40C to +85C; Website developer: http://catcatcat.d-lan.dp.ua/; Assembly type: Basic Extended Part
footprint TO220(5)
pins: 1 Vin, 2 OUT, 3 GND, 4 FEEDBACK, 5 on/off

## LM2576BU
designator ST?  (value not drawn)
Value: *; Publisher: Catcatcat Electronics; Operating Temperature: -40C to +85C; Website developer: http://catcatcat.d-lan.dp.ua/; Assembly type: Basic Extended Part
footprint LM2576BU
pins: 1 Vin, 2 Vout, 3 Ground, 4 Feedback, 5 ~{On}/Off

## LM2594
designator ST?  (value not drawn)
Value: *; Publisher: Catcatcat Electronics; Operating Temperature: -40C to +85C; Website developer: http://catcatcat.d-lan.dp.ua/; Assembly type: Basic Extended Part
footprint SO8
pins: 1 *, 2 *, 3 *, 4 FB, 5 ~{ON}/OFF, 6 Gnd, 7 Vin, 8 Output

## LM4040AIM3-3.0+T (E)
designator REF?, comment value 3V ±0.1%  (hidden comment: LM4040AIM3-3.0+T)
VOLTAGE REFERENCES 3V ±0.1% 100PPM/°C SOT-23(SOT-23-3) ROHS; Manufacturer: Maxim Integrated; Marking: R308; Package / Case: SOT-23; PartNumber LCSC: C143326; Publisher: Catcatcat Electronics; Operating Temperature: -40C to +85C; Tolerance: ±0.1%; Voltage: 3V; HelpURL: https://datasheet.lcsc.com/szlcsc/Maxim-Integrated-LM4040AIM3-3-0-T_C143326.pdf; Manufacturer PartNumber: LM4040AIM3-3.0+T; Website developer: http://catcatcat.d-lan.dp.ua/; Detailed Description: VOLTAGE REFERENCES 3V ±0.1% 100PPM/°C SOT-23(SOT-23-3) ROHS; Pricing LCSC: 0.9667; Assembly type: Extended Part
footprint SOT-23-3M
pins: 1 +, 2 -, 3 NC

## MCP100
designator U?  (value not drawn)
Value: *; Publisher: Catcatcat Electronics; Operating Temperature: -40C to +85C; Website developer: http://catcatcat.d-lan.dp.ua/; Assembly type: Basic Extended Part
footprint SOT-23
pins: 1 ~{RST}, 2 Vdd, 3 Vss

## MCP1525
designator REF?  value MCP1525  (hidden comment: *)
Voltage: 2.5 V; Marking: VA(NN)  NN- Alphanumeric traceability code; Publisher: Catcatcat Electronics; Operating Temperature: -40C to +85C; Website developer: http://catcatcat.d-lan.dp.ua/; Assembly type: Basic Extended Part
footprint TO-92
pins: 1 Vss, 2 Vout, 3 Vin

## MCP1525T-I/TT
designator REF?  value 2.5 V  (hidden comment: *)
SOT-23; Marking: VA(NN)  NN- Alphanumeric traceability code; ComponentLink1URL: http://www.microchip.com/wwwproducts/en/mcp1525; ComponentLink2URL: http://ww1.microchip.com/downloads/en/DeviceDoc/21653C.pdf; Dealer Аlternative: https://detail.1688.com/offer/553368730834.html; Package / Case: SOT-23; PartNumber Digi-Key: 0.40; PartNumber LCSC: 0.19; Publisher: Catcatcat Electronics; Operating Temperature: -40C to +85C; Website developer: http://catcatcat.d-lan.dp.ua/; Assembly type: Basic Extended Part
footprint SOT-23-3N
pins: 1 Vin, 2 Vout, 3 Vss

## MCP1541
designator REF?  value MCP1541-I/TT  (hidden comment: *)
Voltage: 4.096; Marking: VB(NN)  NN- Alphanumeric traceability code; Publisher: Catcatcat Electronics; Operating Temperature: -40C to +85C; Website developer: http://catcatcat.d-lan.dp.ua/; Assembly type: Basic Extended Part
footprint TO-92
pins: 1 Vss, 2 Vout, 3 Vin

## MCP1541-I/TT
designator REF?  value MCP1541-I/TT  (hidden comment: *)
SOT23; Voltage: 4.096; Marking: VB(NN)  NN- Alphanumeric traceability code; ComponentLink1URL: http://www.microchip.com/wwwproducts/en/MCP1541; ComponentLink2URL: http://ww1.microchip.com/downloads/en/DeviceDoc/21653C.pdf; Dealer Аlternative: https://detail.1688.com/offer/37850389909.html; Package / Case: SOT23; PartNumber Digi-Key: 0.48; PartNumber LCSC: 0.19; Publisher: Catcatcat Electronics; Operating Temperature: -40C to +85C; Website developer: http://catcatcat.d-lan.dp.ua/; Assembly type: Basic Extended Part
footprint SOT-23-3N
pins: 1 Vss, 2 Vout, 3 Vin

## MCP1640T-I/CHY
designator ST?  value MCP1640T-I/CHY  (hidden comment: *)
Dealer Аlternative: https://detail.1688.com/offer/44303905271.html; Package / Case: SOT23-6; PartNumber Digi-Key: 0.67; PartNumber LCSC: 0.36; Publisher: Catcatcat Electronics; Operating Temperature: -40C to +85C; Website developer: http://catcatcat.d-lan.dp.ua/; Assembly type: Basic Extended Part
footprint SOT-23-6N
pins: 1 SW, 2 GND, 3 EN, 4 Vfb, 5 Vout, 6 Vin
